# Altium footprint library Library 3D.PcbLib: 288 footprints (part 4 of 18)
Each footprint in its own frame and in the unit in brackets; x right, y up, seen from the top. Pads: shape width x height; smd on the part's side, far side on the other; paste and mask are expansions set on the pad; w line width, h text height; cw(c..) or ccw(c..) is an arc to the next point about the centre after c.
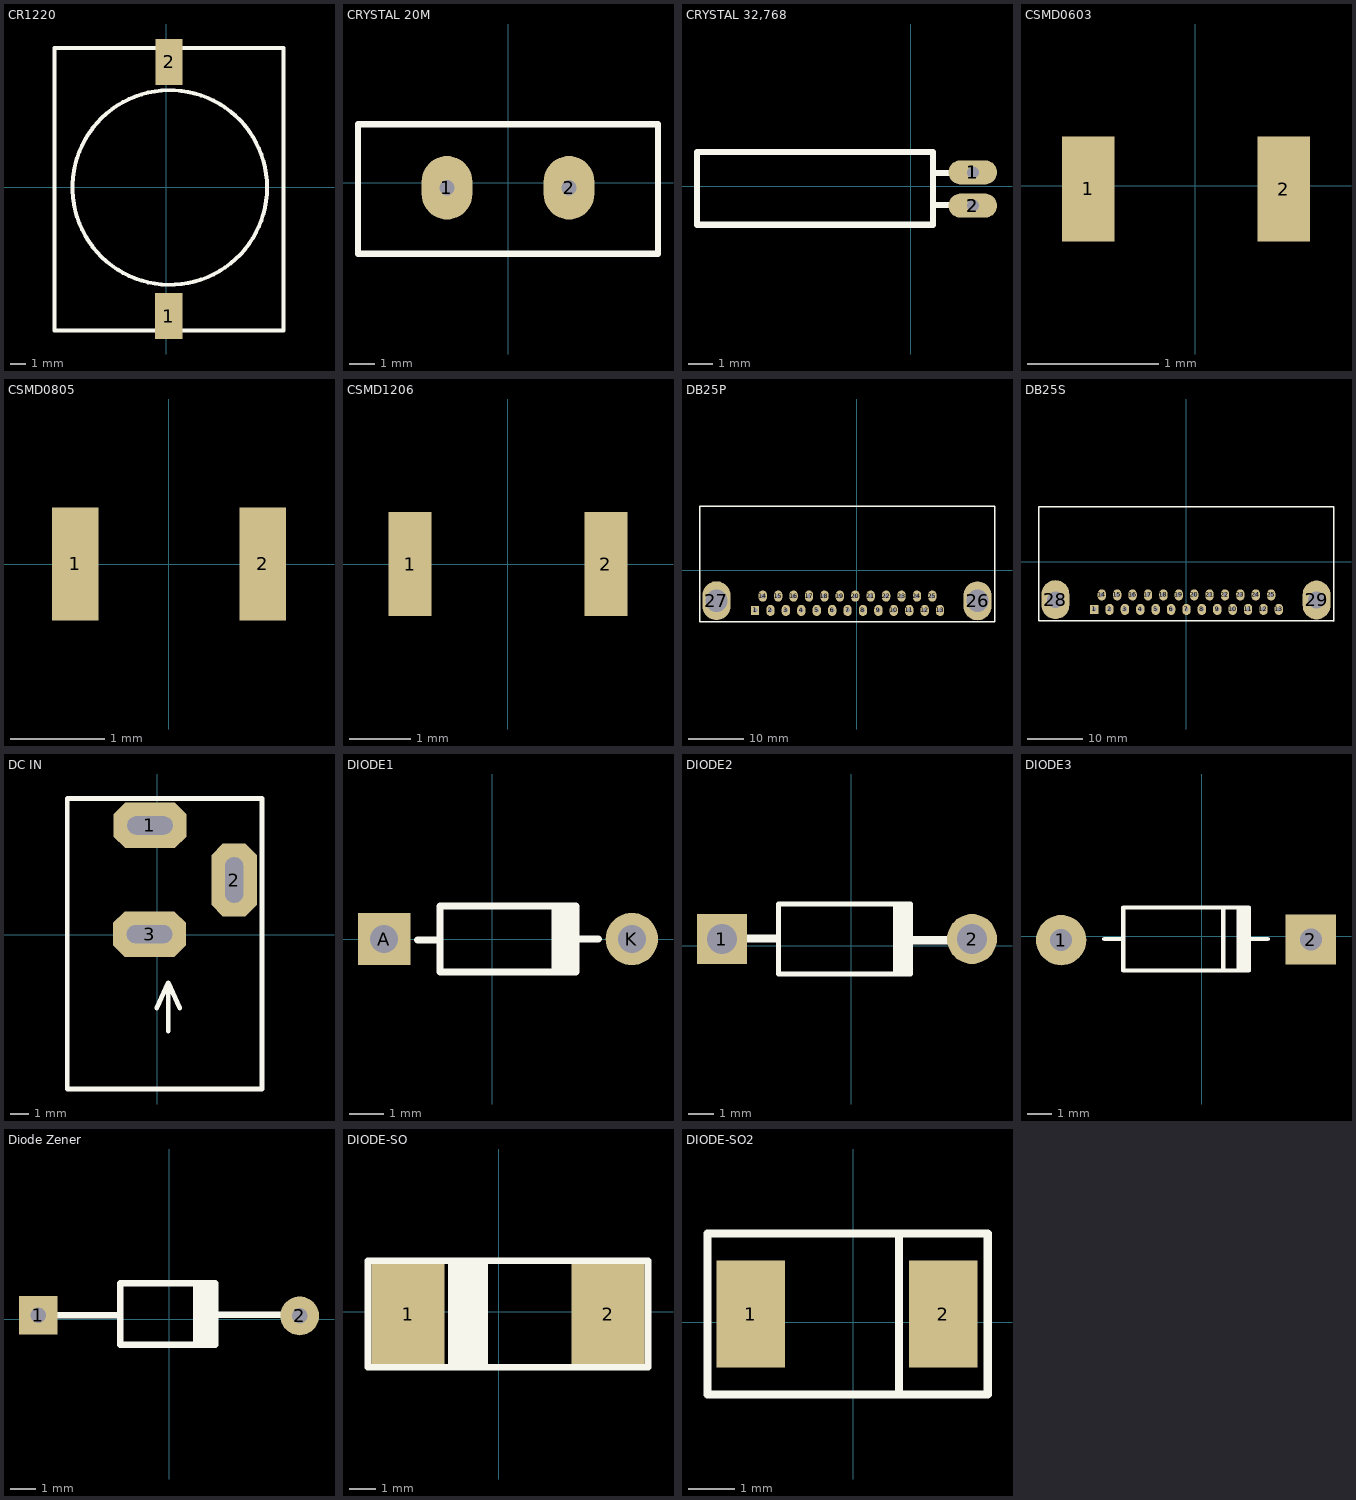
[diagram p3: the footprints below, top view; thin cyan lines are the x and y axes]

## CR1220 [mm]
pads (2):
  rect 1.8x3 smd: 1(0.15,-8.425) 2(0.175,8.225)
Top Overlay:
  circle w0.254: c0.225,0 r6.373
  lines w0.254: -7.323,-9.375 7.672,-9.375 7.673,-9.373 7.673,9.125 -7.323,9.125 -7.323,-9.375
3D body "alsrobot-CR1220.STEP": height 4.94, standoff 0, extent -7.323,-9.375 7.673,9.125

## CRYSTAL 20M [mm]
pads (2):
  oval 2x2.5 hole 0.6: 1(-2.4,-0.2) 2(2.4,-0.2)
Top Overlay:
  lines w0.254: -5.9,-2.8 5.9,-2.8 5.9,2.3 -5.9,2.3 -5.9,-2.8
3D body "SW3dPS-HP49US.STEP": height 3.5, standoff -4, extent -5.675,-2.55 5.675,2.1

## CRYSTAL 32,768 [mm]
pads (4):
  oval 2x1 hole 0.5: 1(2.575,0.575) 1(2.575,0.575) 2(2.575,-0.8) 2(2.575,-0.8)
Top Overlay:
  lines w0.254: -8.825,-1.589 -8.825,1.411 ; -8.825,-1.589 0.925,-1.589 ; -8.825,-1.589 -8.825,1.411 ; -8.825,-1.589 0.925,-1.589 ; -8.825,1.411 0.925,1.411 ; -8.825,1.411 0.925,1.411 ; 0.925,-1.589 0.925,1.411 ; 0.925,-1.589 0.925,1.411 ; 0.925,-0.775 1.7,-0.775 0.925,-0.775 ; 0.975,0.55 1.825,0.55 0.975,0.55
3D body "Assem2.STEP": height 2.07, standoff -3.43, extent -8.825,-1.589 2.776,1.411
3D body "Assem2.STEP": height 2.07, standoff -3.43, extent -8.825,-1.589 2.776,1.411

## CSMD0603 [mm]
pads (2):
  rect 0.4x0.8 smd: 1(-0.82,-0.025) 2(0.675,-0.025)
3D body "CSMD0603.STEP": height 0.79, standoff -0.01, extent -0.82,-0.425 0.82,0.375

## CSMD0805 [mm]
pads (2):
  rect 0.5x1.2 smd: 1(-1,0) 2(1,0)
3D body "CSMD0805.STEP": height 0.78, standoff 0, extent -1,-0.625 1,0.625

## CSMD1206 [mm]
pads (2):
  rect 0.7x1.7 smd: 1(-1.6,0) 2(1.6,0)
3D body "CSMD1206.STEP": height 0.94, standoff 0, extent -1.6,-0.8 1.6,0.8

## DB25P [mm]
pads (27):
  rect 1.5x1.6 hole 0.8: 1(-18.295,-7.22)
  oval 1.5x2 hole 0.8: 2(-15.525,-7.22) 3(-12.755,-7.22) 4(-9.985,-7.22) 5(-7.215,-7.22) 6(-4.445,-7.22) 7(-1.675,-7.22) 8(1.095,-7.22) 9(3.865,-7.22) 10(6.635,-7.22) 11(9.405,-7.22) 12(12.175,-7.22) 13(14.945,-7.22) 14(-16.91,-4.63) 15(-14.14,-4.63) 16(-11.37,-4.63) 17(-8.6,-4.63) 18(-5.83,-4.63) 19(-3.06,-4.63) 20(-0.29,-4.63) 21(2.48,-4.63) 22(5.25,-4.63) 23(8.02,-4.63) 24(10.79,-4.63) 25(13.56,-4.63)
  oval 5x7 hole 4: 26(21.675,-5.5) 27(-25.225,-5.475)
Top Overlay:
  lines w0.254: -28.245,-9.275 -28.245,11.525 24.795,11.525 24.795,-9.275 -28.245,-9.275
3D body "User Library-DB-25P-1A5N-A191-K87.STEP": height 13.57, standoff -3.95, extent -28.245,-9.275 24.795,11.525

## DB25S [mm]
pads (27):
  rect 1.5x1.6 hole 0.8: 1(-16.62,-8.52)
  oval 1.5x2 hole 0.8: 2(-13.85,-8.52) 3(-11.08,-8.52) 4(-8.31,-8.52) 5(-5.54,-8.52) 6(-2.77,-8.52) 7(0,-8.52) 8(2.77,-8.52) 9(5.54,-8.52) 10(8.31,-8.52) 11(11.08,-8.52) 12(13.85,-8.52) 13(16.62,-8.52) 14(-15.235,-5.93) 15(-12.465,-5.93) 16(-9.695,-5.93) 17(-6.925,-5.93) 18(-4.155,-5.93) 19(-1.385,-5.93) 20(1.385,-5.93) 21(4.155,-5.93) 22(6.925,-5.93) 23(9.695,-5.93) 24(12.465,-5.93) 25(15.235,-5.93)
  oval 5x7 hole 3: 28(-23.575,-6.775) 29(23.4,-6.825)
Top Overlay:
  lines w0.254: -26.575,-10.6 -26.575,9.93 26.525,9.93 26.475,9.88 26.475,-10.65 26.425,-10.6 -26.575,-10.6
3D body "User Library-DB-25S-1A5N-A191-A197.STEP": height 13.57, standoff -3.68, extent -26.575,-10.6 26.525,9.93

## DC IN [mm]
pads (3):
  oct 4x2.5 hole 1 slot 2.5 at 0 deg paste+1: 1(-0.4,6) 3(-0.425,0.025)
  oct 2.5x4 hole 1 slot 2.5 at 90 deg paste+1: 2(4.225,3)
Top Overlay:
  lines w0.254: -0.034,-4.034 0.601,-2.637 ; 0.601,-5.304 0.601,-2.637 ; 1.236,-4.034 0.601,-2.637 ; -4.936,-8.479 -4.936,7.475 5.75,7.475 5.75,-8.479 -4.936,-8.479
3D body "User Library-PowerJack-2_5x5_7mm.step": height 11, standoff -3.5, extent -4.963,-8.439 4.437,6.761

## DIODE1 [mm]
pads (2):
  rect 1.5x1.5 hole 0.8: A(-3.1,0)
  round 1.5 hole 0.8: K(4,0)
Top Overlay:
  rectangle: 1.7,-0.95 2.5,0.95
  lines w0.2: -2.141,-0.025 -1.531,-0.025 ; 2.33,0 3.041,0 ; 2.4,-0.95 -1.5,-0.95 -1.5,0.95 2.4,0.95
3D body "User Library-1n4148-1.STEP": height 2, standoff -4.5, extent -3.3,-1 4.2,1

## DIODE2 [mm]
pads (2):
  rect 2x2 hole 1.2: 1(-5.177,0.275)
  round 2 hole 1.2: 2(4.83,0.275)
Top Overlay:
  rectangle: 2.425,0.05 3.9,0.4
  rectangle: -4.2,0.125 -2.875,0.45
  rectangle: 1.675,-1.125 2.475,1.675
  lines w0.2: 2.375,-1.125 -2.925,-1.125 -2.925,1.675 2.375,1.675
3D body "SW3dPS-DO-41.STEP": height 2.86, standoff -2.5, extent -5.599,-1.087 5.261,1.638

## DIODE3 [mil]
pads (2):
  round 80 hole 35: 1(-223.43,-5.91)
  rect 80x80 hole 35: 2(173.23,-4.92)
Top Overlay:
  region: 74.92,45.98 54.92,45.98 54.92,-54.02 74.92,-54.02
  lines w7: -155.08,-4.02 -125.08,-4.02 ; 33.92,-51.02 33.92,45.98 ; 74.92,-25.02 74.92,-4.02 ; 74.92,11.98 74.92,-4.02 ; 104.92,-4.02 74.92,-4.02 ; 74.92,-4.02 74.92,-54.02 -125.08,-54.02 -125.08,45.98 74.92,45.98 74.92,-4.02
3D body "SW3dPS-do_35.STEP": height 84.5, standoff -100, extent -234.57,-40.02 186.41,28.98

## Diode SMD [mm]

## Diode Zener [mm]
pads (2):
  rect 1.5x1.5 hole 0.6: 1(-5.075,0.15)
  round 1.5 hole 0.6: 2(5.05,0.125)
Top Overlay:
  rectangle: 0.925,-1 1.775,1.4
  lines w0.254: -4.375,0.15 -1.9,0.15 ; 1.775,0.175 4.275,0.175 ; -1.9,-1 -1.9,1.4 1.775,1.4 1.775,-1 -1.9,-1
3D body "User Library-Silicone Diode 3_9x2_6.STEP": height 2.83, standoff -1.28, extent -5.36,-1.175 5.36,1.475

## DIODE-SO [mil]
pads (2):
  rect 110x150 smd: 1(-136.46,-3.07) 2(163.54,-3.07)
Top Overlay:
  rectangle: -76.46,-83.07 -16.46,76.93
  lines w10: -196.46,-83.07 -196.46,76.93 223.54,76.93 223.54,-83.07 -196.46,-83.07
3D body "SW3DPS-DIOD SMD 10BF10-DEFAULT.STEP": height 96.27, standoff 0.6, extent -89.78,-75.93 118.87,65.8

## DIODE-SO2 [mm]
pads (2):
  rect 1.47x2.3 smd: 1(-2.2,0.175) 2(1.925,0.175)
Top Overlay:
  lines w0.178: 0.975,-1.55 0.975,1.9 ; -3.125,-1.55 -3.125,1.9 2.875,1.9 2.875,-1.55 -3.125,-1.55
3D body "User Library-DO-214AA SMB.step": height 2.25, standoff -0.05, extent -2.837,-1.625 2.563,1.975